# Altium footprint library IC.PcbLib: 162 footprints (part 1 of 11)
Each footprint in its own frame and in the unit in brackets; x right, y up, seen from the top. Pads: shape width x height; smd on the part's side, far side on the other; paste and mask are expansions set on the pad; w line width, h text height; cw(c..) or ccw(c..) is an arc to the next point about the centre after c.
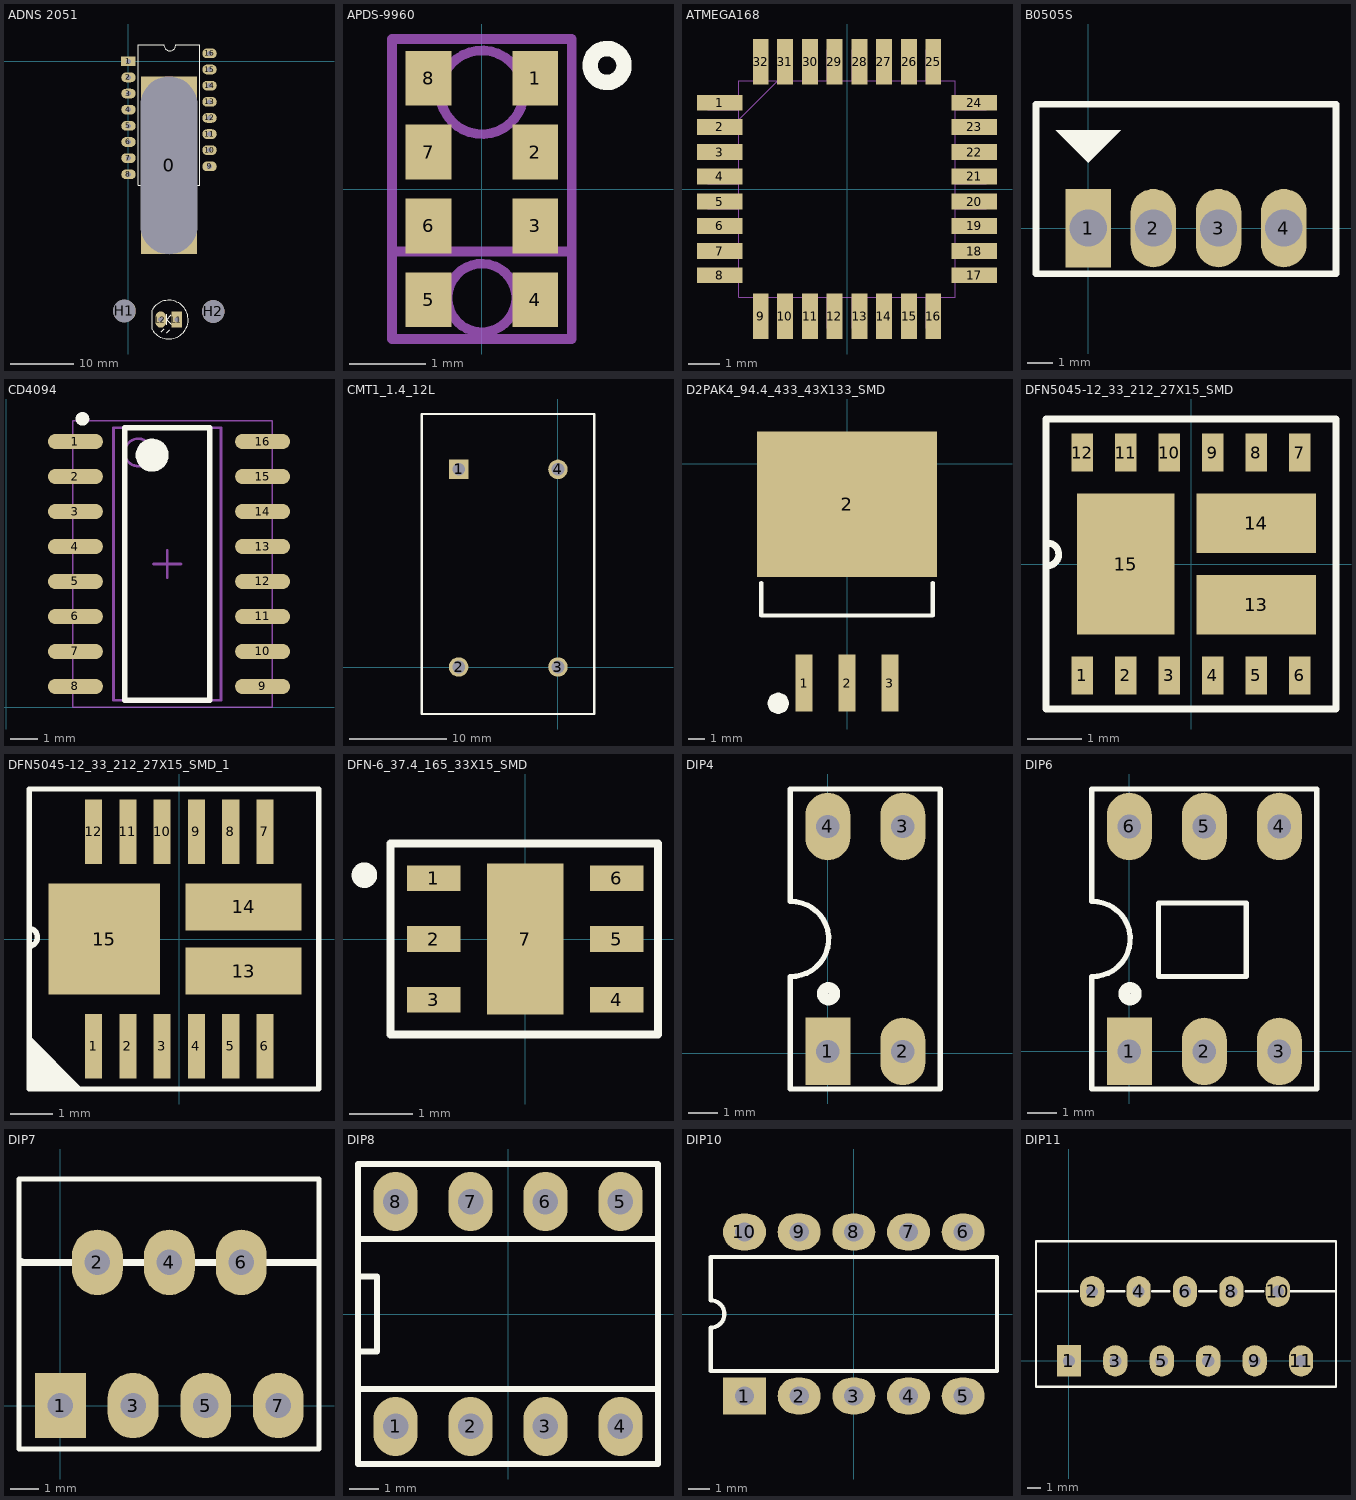
[diagram p0: the footprints below, top view; thin cyan lines are the x and y axes]

## ADNS 2051 [mil] "Foots pin for Mouse"
pads (21):
  rect 350x1100 hole 350 slot 1100 at 90 deg: 0(251,-645)
  rect 90x60 hole 31: 1(0,0)
  oval 90x60 hole 31: 2(0,-100) 3(0,-200) 4(0,-300) 5(0,-400) 6(0,-500) 7(0,-600) 8(0,-700) 9(502,-651) 10(502,-551) 11(502,-451) 12(502,-351) 13(502,-251) 14(502,-151) 15(502,-51) 16(502,49)
  round 140 hole 140: H1(-25,-1547) H2(525,-1550)
  rect 65x100 hole 32: L1(300,-1600.5)
  oval 65x100 hole 32: L2(200,-1600.5)
Top Overlay:
  lines w7: 146,-1660.5 146,-1541.5 ; 146.06,-1540.53 cw(c250,-1600.5) 146.49,-1661.21 ; 204,-1675.5 221,-1658.5 ; 218,103 59,103 59,-767 443,-767 443,103 296,103 ; 218.97,101 ccw(c255.99,101) 293,101 ; 236,-1632.5 236,-1566.5 ; 238,-1681.5 255,-1664.5 ; 265,-1629.5 236,-1600.5 265,-1571.5 ; 394.94,-516.95 ccw(c252.8,-525.96) 395,-518
  text "ADNS2051" at 108,-229 h40

## APDS-9960 [mm]
pads (8):
  rect 0.6x0.72 smd: 1(0.7,1.455) 2(0.7,0.485) 3(0.7,-0.485) 4(0.7,-1.455) 5(-0.7,-1.455) 6(-0.7,-0.485) 7(-0.7,0.485) 8(-0.7,1.455)
Top Overlay:
  circle w0.203: c1.644,1.622 r0.223
Mechanical 13:
  circle w0.127: c0,-1.43 r0.45
  circle w0.127: c0,1.27 r0.55
  lines w0.127: -1.18,-0.82 1.18,-0.82 ; -1.18,-0.82 -1.18,-1.97 1.18,-1.97 1.18,-0.82 ; -1.18,-0.82 -1.18,1.97 1.18,1.97 1.18,-0.82
3D body "step_temp.STEP": height 1.55, standoff 0, extent -1.18,-1.97 1.18,1.97

## ATMEGA168 [mil]
pads (32):
  rect 58x20 smd: 1(-162,110) 2(-162,79) 3(-162,47) 4(-162,16) 5(-162,-16) 6(-162,-47) 7(-162,-79) 8(-162,-110) 17(162,-110) 18(162,-79) 19(162,-47) 20(162,-16) 21(162,16) 22(162,47) 23(162,79) 24(162,110)
  rect 20x58 smd: 9(-110,-162) 10(-79,-162) 11(-47,-162) 12(-16,-162) 13(16,-162) 14(47,-162) 15(79,-162) 16(110,-162) 25(110,162) 26(79,162) 27(47,162) 28(16,162) 29(-16,162) 30(-47,162) 31(-79,162) 32(-110,162)
Mechanical 13:
  drawing of 169 lines, arcs and shapes, not listed
3D body "ATMEGA168-20AU.STEP": height 46.67, standoff -0.57, extent -177.16,-177.16 177.17,177.16

## B0505S [mil]
pads (4):
  rect 70x120 hole 57: 1(0,0)
  oval 70x120 hole 57: 2(100,0) 3(200,0) 4(300,0)
Top Overlay:
  region: -50,150 50,150 0,100
  lines w10: -80,-70 380,-70 380,190 -80,190 -80,-60 -80,-70
3D body "B0505s.step": height 393.7, standoff -141.73, extent -76.38,-50 376.38,186.22

## CD4094 [mm]
pads (16):
  oval 2x0.55 smd: 1(2.507,9.652) 2(2.507,8.382) 3(2.507,7.112) 4(2.507,5.842) 5(2.507,4.572) 6(2.507,3.302) 7(2.507,2.032) 8(2.507,0.762) 9(9.304,0.762) 10(9.304,2.032) 11(9.304,3.302) 12(9.304,4.572) 13(9.304,5.842) 14(9.304,7.112) 15(9.304,8.382) 16(9.304,9.652)
Top Overlay:
  circle w0.25: c2.761,10.477 r0.125
  circle w0.6: c5.292,9.157 r0.3
  lines w0.2: 4.292,0.257 4.292,10.157 7.392,10.157 7.392,0.257 4.292,0.257
Mechanical 13:
  circle w0.1: c4.792,9.257 r0.5
  lines w0.1: 3.892,0.257 3.892,10.157 7.792,10.157 7.792,0.257 3.892,0.257
Mechanical 15:
  lines w0.05: 2.413,0.007 2.413,10.407 9.652,10.407 9.652,0.007 2.413,0.007
  lines w0.1: 5.342,5.207 6.342,5.207 ; 5.842,4.707 5.842,5.707
3D body "User Library-SOIC-16-1.step": height 1.4, standoff 0, extent 2.969,0.381 8.969,10.281

## CMT1_1.4_12L [mm] "CASE: TH"
height 33
pads (4):
  rect 2x2 hole 1.3: 1(-10.2,20.3)
  round 2 hole 1.3: 2(-10.2,0) 3(0,0) 4(0,20.3)
Top Overlay:
  lines w0.254: -13.995,-4.826 3.734,-4.826 3.734,25.984 -13.995,25.984 -13.995,20.195 -13.995,-4.826
3D body: height 33, standoff 0.1, extent -13.741,-4.521 3.531,25.781

## D2PAK4_94.4_433_43X133_SMD [mm]
pads (5):
  rect 1x3.4 smd: 1(-2.54,-13) 2(0,-13) 3(2.54,-13)
  rect 10.7x8.6 smd: 2(0,-2.4)
  round 1.27 on Top Overlay: ""(-4.075,-14.2)
Top Overlay:
  lines w0.254: -5.08,-7.067 -5.08,-9 5.08,-9 5.08,-7.067
3D body "User Library-TO263-3-1.STEP": height 4.6, standoff -0.03, extent -5.193,-13.894 5.207,1.956

## DFN5045-12_33_212_27X15_SMD [mm] "CASE: DFN5045"
height 0.8
pads (15):
  rect 0.4x0.7 smd: 1(-2,-2.05) 2(-1.2,-2.05) 3(-0.4,-2.05) 4(0.4,-2.05) 5(1.2,-2.05) 6(2,-2.05) 7(2,2.05) 8(1.2,2.05) 9(0.4,2.05) 10(-0.4,2.05) 11(-1.2,2.05) 12(-2,2.05)
  rect 2.2x1.1 smd: 13(1.2,-0.75) 14(1.2,0.75)
  rect 1.8x2.6 smd: 15(-1.2,0)
Top Overlay:
  lines w0.127: -2.623,0.386 cw(c-2.642,0.178) -2.601,-0.028 ; -2.667,-2.667 2.667,-2.667 2.667,2.667 -2.667,2.667 -2.667,-2.667
3D body "DMHT6016LFJ-13.stp": height 0.9, standoff 0, extent -2.5,-2.36 2.5,2.36

## DFN5045-12_33_212_27X15_SMD_1 [mm] "CASE: DFN5045"
height 0.8
pads (15):
  rect 0.4x1.5 smd: 1(-2,-2.5) 2(-1.2,-2.5) 3(-0.4,-2.5) 4(0.4,-2.5) 5(1.2,-2.5) 6(2,-2.5) 7(2,2.5) 8(1.2,2.5) 9(0.4,2.5) 10(-0.4,2.5) 11(-1.2,2.5) 12(-2,2.5)
  rect 2.7x1.1 smd: 13(1.5,-0.75) 14(1.5,0.75)
  rect 2.6x2.6 smd: 15(-1.75,0)
Top Overlay:
  region: -3.5,-2.25 -2.25,-3.5 -3.5,-3.5
  lines w0.127: -3.5,0.25 cw(c-3.519,0.041) -3.478,-0.164 ; -3.5,-3.5 3.25,-3.5 3.25,3.5 -3.5,3.5 -3.5,-3.5
3D body "DMHT6016LFJ-13.stp": height 0.9, standoff 0, extent -2.5,-2.36 2.5,2.36

## DFN-6_37.4_165_33X15_SMD [mm] "DFN Package"
height 0.6
pads (7):
  rect 0.84x0.4 smd mask+0.076: 1(-1.435,0.95) 2(-1.435,0) 3(-1.435,-0.95) 4(1.435,-0.95) 5(1.435,0) 6(1.435,0.95)
  rect 1.2x2.365 smd mask+0.076: 7(0,0)
Top Overlay:
  circle w0.2: c-2.52,1 r0.1
  lines w0.127: 1.435,1.5 2.081,1.5 2.083,1.499 2.083,-1.499 2.081,-1.5 1.5,-1.5 -1.5,-1.5 -2.108,-1.5 -2.108,1.5 -1.5,1.5 1.5,1.5
Top Paste:
  region: -0.57,0.83 0.57,0.83 0.57,-0.83 -0.57,-0.83
3D body "User Library-DFN6-3x3x0_80.step": height 0.85, standoff 0.05, extent -1.5,-1.5 1.5,1.5

## DIP4 [mil] "W.300/L.400"
height 220.08
pads (4):
  rect 60x90 hole 31: 1(0,2.52)
  oval 60x90 hole 31: 2(100,2.52) 3(100,302.52) 4(0,302.52)
Top Overlay:
  circle w15: c1,79.52 r8
  lines w7: -50.38,102.57 ccw(c-48.68,152.54) -50,202.52 ; -50,102.52 -50,-47.48 150,-47.48 150,352.52 -50,352.52 -50,203.52
3D body "SW3DPS-DIP4-DEFAULT.STEP": height 169.69, standoff -129.13, extent -59.05,-7.48 159.06,307.48

## DIP6 [mil] "6 PIN, W 300mil, Pin to pin 100mil"
height 100
pads (6):
  rect 60x90 hole 31.5: 1(0,0)
  oval 60x90 hole 31.5: 2(100,0) 3(200,0) 4(200,300) 5(100,300) 6(0,300)
Top Overlay:
  circle w15: c1,77 r8
  lines w7: -50.38,100.05 ccw(c-48.69,150.02) -50,200 ; -50,100 -50,-50 250,-50 250,350 -50,350 -50,201 ; 39,100 156,100 156,198 39,198 39,100
3D body "SW3DPS-DIP6-DEFAULT.STEP": height 169.69, standoff -129.13, extent -58.11,-7.48 260,307.48

## DIP7 [mil]
pads (7):
  rect 70x90 hole 35: 1(0,0)
  oval 70x90 hole 35: 2(51,197) 3(100,0) 4(150,197) 5(200,0) 6(249,197) 7(300,0)
Top Overlay:
  lines w7: -57,-60 356,-60 356,312 -57,312 -57,-60
  lines w10: -54,198 -54,197 354,197
3D body "User Library-TO-220(T).STEP": height 756.77, standoff -77.87, extent -50.57,-11.02 351,311.02

## DIP8 [mm] "W.300/L.400"
pads (8):
  oval 1.5x2 hole 0.864: 1(-3.81,-3.81) 2(-1.27,-3.81) 3(1.27,-3.81) 4(3.81,-3.81) 5(3.81,3.81) 6(1.27,3.81) 7(-1.27,3.81) 8(-3.81,3.81)
Top Overlay:
  lines w0.203: -5.08,-2.54 5.08,-2.54 ; -5.08,-2.54 -5.08,2.54 ; -5.08,-2.54 5.08,-2.54 ; -5.08,-2.54 -5.08,2.54 ; -5.08,-2.54 -5.08,-5.08 5.08,-5.08 5.08,2.54 ; -5.08,-2.54 -5.08,-1.27 ; -5.08,-1.27 -4.445,-1.27 ; -5.08,-1.27 -4.445,-1.27 ; -5.08,-1.27 -5.08,1.27 ; -5.08,1.27 -4.445,1.27 ; -5.08,1.27 -4.445,1.27 ; -5.08,1.27 -5.08,5.08 5.08,5.08 5.08,2.54 ; -5.08,2.54 5.08,2.54 ; -5.08,2.54 5.08,2.54 ; -4.445,-1.27 -4.445,1.27 ; -4.445,-1.27 -4.445,1.27 ; 5.08,-2.54 5.08,2.54 ; 5.08,-2.54 5.08,2.54
3D body "User Library-DIP8-300-metric.step": height 4.5, standoff -3.5, extent -5.4,-3.88 5.4,3.88

## DIP10 [mm] "DIP; 10 Leads; Row Spacing 7.62 mm; Pitch 2.54 mm"
height 4.42
pads (10):
  rect 2x1.7 hole 0.9: 1(-5.08,-3.81)
  oval 2x1.7 hole 0.9: 2(-2.54,-3.81) 3(0,-3.81) 4(2.54,-3.81) 5(5.08,-3.81) 6(5.08,3.81) 7(2.54,3.81) 8(0,3.81) 9(-2.54,3.81) 10(-5.08,3.81)
Top Overlay:
  lines w0.2: -6.65,-2.65 6.65,-2.65 6.65,2.65 -6.65,2.65 -6.65,0.635 cw(c-6.65,0) -6.65,-0.635 -6.65,-2.65

## DIP11 [mil] "11 Pin so le hai hang cach nhau 200mil., Pin to pin 100mil"
pads (11):
  rect 70x90 hole 35: 1(0,0)
  oval 70x90 hole 35: 2(66.93,200) 3(133.86,0) 4(200.79,200) 5(267.72,0) 6(334.65,200) 7(401.57,0) 8(468.5,200) 9(535.43,0) 10(602.36,200) 11(669.29,0)
Top Overlay:
  lines w7: -95,200 25,200 ; 110,200 160,200 ; 240,200 290,200 ; 375,200 425,200 ; 510,200 560,200 ; 630,200 770,200 ; -95,-75 770,-75 770,345 -95,345 -95,-75